# Altium footprint library IC.PcbLib: 44 footprints (part 3 of 3)
Each footprint in its own frame and in the unit in brackets; x right, y up, seen from the top. Pads: shape width x height; smd on the part's side, far side on the other; paste and mask are expansions set on the pad; w line width, h text height; cw(c..) or ccw(c..) is an arc to the next point about the centre after c.
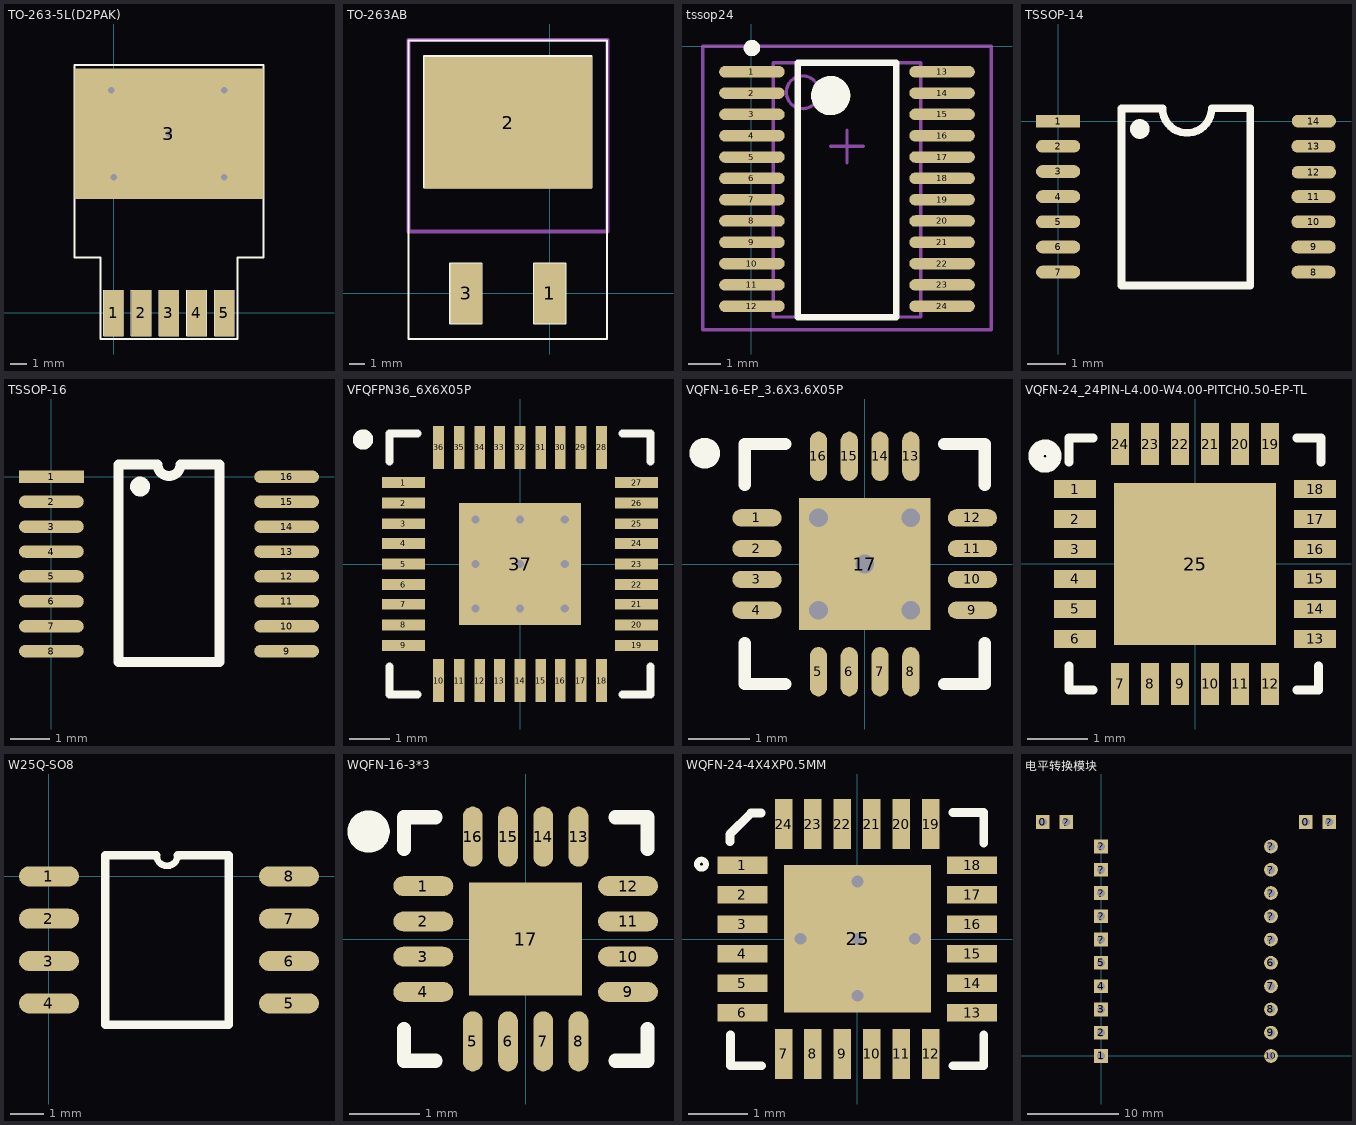
[diagram p2: the footprints below, top view; thin cyan lines are the x and y axes]

## TO-263-5L(D2PAK) [mm]
pads (6):
  rect 1.203x2.803 smd: 1(0,0) 2(1.7,0) 3(3.4,0) 4(5.1,0) 5(6.8,0)
  rect 11.6x8 smd: 3(3.4,11)
via 3.4,11 diameter 0.7 hole 0.4
via 0,8.333 diameter 0.7 hole 0.4
via 6.8,13.667 diameter 0.7 hole 0.4
via 6.8,8.333 diameter 0.7 hole 0.4
via -0.127,13.667 diameter 0.7 hole 0.4
Top Overlay:
  lines w0.025: -0.6,-1.398 0.604,-1.398 ; -0.6,-1.398 -0.6,1.406 ; -0.6,-1.398 0.604,-1.398 ; -0.6,-1.398 -0.6,1.406 ; -0.6,1.406 0.604,1.406 ; -0.6,1.406 0.604,1.406 ; 0.604,-1.398 0.604,1.406 ; 0.604,-1.398 0.604,1.406 ; 1.1,-1.398 2.304,-1.398 ; 1.1,-1.398 1.1,1.406 ; 1.1,-1.398 2.304,-1.398 ; 1.1,-1.398 1.1,1.406 ; 1.1,1.406 2.304,1.406 ; 1.1,1.406 2.304,1.406 ; 2.304,-1.398 2.304,1.406 ; 2.304,-1.398 2.304,1.406 ; 2.8,-1.398 4.004,-1.398 ; 2.8,-1.398 2.8,1.406 ; 2.8,-1.398 4.004,-1.398 ; 2.8,-1.398 2.8,1.406 ; 2.8,1.406 4.004,1.406 ; 2.8,1.406 4.004,1.406 ; 4.004,-1.398 4.004,1.406 ; 4.004,-1.398 4.004,1.406 ; 4.5,-1.398 5.704,-1.398 ; 4.5,-1.398 4.5,1.406 ; 4.5,-1.398 5.704,-1.398 ; 4.5,-1.398 4.5,1.406 ; 4.5,1.406 5.704,1.406 ; 4.5,1.406 5.704,1.406 ; 5.704,-1.398 5.704,1.406 ; 5.704,-1.398 5.704,1.406 ; 6.2,-1.398 7.404,-1.398 ; 6.2,-1.398 6.2,1.406 ; 6.2,-1.398 7.404,-1.398 ; 6.2,-1.398 6.2,1.406 ; 6.2,1.406 7.404,1.406 ; 6.2,1.406 7.404,1.406 ; 7.404,-1.398 7.404,1.406 ; 7.404,-1.398 7.404,1.406
  lines w0.127: -0.798,15.204 -2.398,15.204 ; -2.398,15.204 9.202,15.204 9.202,3.404 7.602,3.404 7.602,-1.596 -0.798,-1.596 -0.798,3.404 -2.398,3.404 -2.398,15.204
3D body "User Library-D2PAK TO-263-5.STEP": height 4.87, standoff 0, extent -1.651,-0.842 8.509,13.388

## TO-263AB [mm]
pads (3):
  rect 2x3.81 smd: 1(0,0) 3(-5.325,0)
  rect 10.66x8.38 smd: 2(-2.65,10.875)
Top Overlay:
  lines w0.127: -9.018,-2.898 3.642,-2.898 3.642,16.122 -9.018,16.122 -9.018,-2.898 ; -8.018,6.742 -8.018,15.122 2.642,15.122 2.642,6.742 -8.018,6.742 ; -6.358,-1.898 -6.358,1.912 -4.358,1.912 -4.358,-1.898 -6.358,-1.898 ; -1.018,-1.898 0.982,-1.898 0.982,1.912 -1.018,1.912 -1.018,-1.898
Mechanical 13:
  lines w0.254: -9.017,3.937 -9.017,16.129 3.683,16.129 3.683,3.937 -9.017,3.937
3D body "TO263-3S.STEP": height 4.88, standoff 0.08, extent -7.692,-0.811 2.308,14.859

## tssop24 [mm]
height 1
pads (24):
  oval 2x0.35 smd: 1(0.021,-0.773) 2(0.021,-1.423) 3(0.021,-2.073) 4(0.021,-2.723) 5(0.021,-3.373) 6(0.021,-4.023) 7(0.021,-4.673) 8(0.021,-5.323) 9(0.021,-5.973) 10(0.021,-6.623) 11(0.021,-7.273) 12(0.021,-7.923) 13(5.821,-0.773) 14(5.821,-1.423) 15(5.821,-2.073) 16(5.821,-2.723) 17(5.821,-3.373) 18(5.821,-4.023) 19(5.821,-4.673) 20(5.821,-5.323) 21(5.821,-5.973) 22(5.821,-6.623) 23(5.821,-7.273) 24(5.821,-7.923)
Top Overlay:
  circle w0.6: c2.421,-1.498 r0.3
  circle w0.25: c0.021,-0.048 r0.125
  lines w0.2: 1.421,-8.255 4.421,-8.255 4.421,-0.498 1.421,-0.498 1.421,-8.255
Mechanical 13:
  circle w0.1: c1.571,-1.398 r0.5
  lines w0.1: 0.671,-8.255 5.171,-8.255 5.171,-0.498 0.671,-0.498 0.671,-8.255
Mechanical 15:
  lines w0.1: 2.421,-3.048 3.421,-3.048 ; 2.921,-3.548 2.921,-2.548 ; -1.479,-8.638 -1.479,0.002 7.321,0.002 7.321,-8.638 5.121,-8.638 0.721,-8.638 -1.479,-8.638
3D body: height 1.1, standoff 0, extent 0.671,-8.255 5.171,-0.498

## TSSOP-14 [mm] "4.96x4.40x1.00 e=0.65（蒜米工坊）"
pads (14):
  rect 1.143x0.33 smd: 1(0,0)
  oval 1.143x0.33 smd: 2(0,-0.65) 3(0,-1.3) 4(0,-1.95) 5(0,-2.6) 6(0,-3.25) 7(0,-3.9) 8(6.6,-3.9) 9(6.6,-3.25) 10(6.6,-2.6) 11(6.6,-1.95) 12(6.608,-1.321) 13(6.6,-0.65) 14(6.608,0)
Top Overlay:
  circle w0.254: c2.112,-0.203 r0.127
  lines w0.2: 2.687,0.325 1.635,0.325 1.635,-4.249 4.965,-4.249 4.965,0.325 ; 2.696,0.33 ccw(c3.331,0.33) 3.966,0.33 4.96,0.33
3D body "TSSOP14.STEP": height 1.03, standoff -0.02, extent 0.028,-4.43 6.432,0.57

## TSSOP-16 [mil] "4.96x4.40x1.00 e=0.65（蒜米工坊）"
pads (16):
  rect 65x12.5 smd: 1(0,0)
  oval 65x12.5 smd: 2(0,-25) 3(0,-50) 4(0,-75) 5(0,-100) 6(0,-125) 7(0,-150) 8(0,-175) 9(236,-175) 10(236,-150) 11(236,-125) 12(236,-100) 13(236,-75) 14(236,-50) 15(236,-25) 16(236,0)
Top Overlay:
  lines w10: 89,-14.79 cw(c89,-9.79) 89.71,-14.74 ; 67.5,-186 67.5,12.5 106.46,12.5 ccw(c118,12.5) 129.54,12.5 168.5,12.5 168.5,-186 67.5,-186
3D body "TSSOP16.STEP": height 40.55, standoff -0.76, extent -6.06,-187.42 246.08,9.43

## VFQFPN36_6X6X05P [mil]
pads (37):
  rect 41.5x10.5 smd: 1(-113,79) 2(-113,59) 3(-113,39) 4(-113,20) 5(-113,0) 6(-113,-20) 7(-113,-39) 8(-113,-59) 9(-113,-79) 19(113,-79) 20(113,-59) 21(113,-39) 22(113,-20) 23(113,0) 24(113,20) 25(113,39) 26(113,59) 27(113,79)
  rect 10.5x41.5 smd: 10(-79,-113) 11(-59,-113) 12(-39,-113) 13(-20,-113) 14(0,-113) 15(20,-113) 16(39,-113) 17(59,-113) 18(79,-113) 28(79,113) 29(59,113) 30(39,113) 31(20,113) 32(0,113) 33(-20,113) 34(-39,113) 35(-59,113) 36(-79,113)
  rect 118.5x118.5 smd: 37(0,0)
via -43.3,43.3 diameter 19.7 hole 7.9
via 0,43.3 diameter 19.7 hole 7.9
via 43.3,43.3 diameter 19.7 hole 7.9
via -43.3,0 diameter 19.7 hole 7.9
via 0,0 diameter 19.7 hole 7.9
via 43.3,0 diameter 19.7 hole 7.9
via -43.3,-43.3 diameter 19.7 hole 7.9
via 0,-43.3 diameter 19.7 hole 7.9
via 43.3,-43.3 diameter 19.7 hole 7.9
Top Overlay:
  lines w7.9: -126.6,-99.4 -126.6,-126.6 -99.4,-126.6 ; -126.6,99.4 -126.6,126.6 -99.4,126.6 ; 99.4,-126.6 126.6,-126.6 126.6,-99.4 ; 99.4,126.6 126.6,126.6 126.6,99.4
  lines w9.8: -147.3,120.6 cw(c-152.2,120.65) -147.3,120.7

## VQFN-16-EP_3.6X3.6X05P [mm]
pads (17):
  oval 0.8x0.28 smd: 1(-1.75,0.75) 2(-1.75,0.25) 3(-1.75,-0.25) 4(-1.75,-0.75) 9(1.75,-0.75) 10(1.75,-0.25) 11(1.75,0.25) 12(1.75,0.75)
  oval 0.28x0.8 smd: 5(-0.75,-1.75) 6(-0.25,-1.75) 7(0.25,-1.75) 8(0.75,-1.75) 13(0.75,1.75) 14(0.25,1.75) 15(-0.25,1.75) 16(-0.75,1.75)
  rect 2.14x2.14 smd: 17(0,0)
via 0.75,-0.75 diameter 0.61 hole 0.305
via -0.75,-0.75 diameter 0.61 hole 0.305
via -0.75,0.75 diameter 0.61 hole 0.305
via 0.75,0.75 diameter 0.61 hole 0.305
via 0,0 diameter 0.61 hole 0.305
Top Overlay:
  lines w0.2: -1.95,-1.29 -1.95,-1.95 -1.29,-1.95 ; -1.95,1.29 -1.95,1.95 -1.29,1.95 ; 1.29,-1.95 1.95,-1.95 1.95,-1.29 ; 1.29,1.95 1.95,1.95 1.95,1.29
  lines w0.25: -2.474,1.798 cw(c-2.599,1.8) -2.474,1.801
Top Paste:
  region: -0.15,1 -0.15,0.15 -1,0.15 -1,1
  region: -1,-1 -1,-0.15 -0.15,-0.15 -0.15,-1
  region: 1,1 1,0.15 0.15,0.15 0.15,1
  region: 0.15,-1 0.15,-0.15 1,-0.15 1,-1

## VQFN-24_24PIN-L4.00-W4.00-PITCH0.50-EP-TL [mm]
pads (25):
  rect 0.7x0.3 smd: 1(-2,1.25) 2(-2,0.75) 3(-2,0.25) 4(-2,-0.25) 5(-2,-0.75) 6(-2,-1.25) 13(2,-1.25) 14(2,-0.75) 15(2,-0.25) 16(2,0.25) 17(2,0.75) 18(2,1.25)
  rect 0.3x0.7 smd: 7(-1.25,-2) 8(-0.75,-2) 9(-0.25,-2) 10(0.25,-2) 11(0.75,-2) 12(1.25,-2) 19(1.25,2) 20(0.75,2) 21(0.25,2) 22(-0.25,2) 23(-0.75,2) 24(-1.25,2)
  rect 2.7x2.7 smd: 25(-0.001,-0.001)
Top Overlay:
  circle w0.254: c-2.504,1.8 r0.15
  lines w0.15: -2.104,1.7 -2.104,2.1 -1.7,2.1 ; -2.1,-1.7 -2.1,-2.1 -1.7,-2.1 ; 1.696,2.1 2.096,2.1 2.096,1.7 ; 1.7,-2.1 2.059,-2.1 2.059,-1.7

## W25Q-SO8 [mm]
pads (8):
  oval 1.8x0.6 smd: 1(0,0) 2(0,-1.27) 3(0,-2.54) 4(0,-3.81) 5(7.2,-3.81) 6(7.2,-2.54) 7(7.2,-1.27) 8(7.2,0)
Top Overlay:
  lines w0.2: 3.225,0.635 ccw(c3.542,0.635) 3.86,0.635
  lines w0.254: 3.225,0.635 1.687,0.635 1.687,-4.445 5.397,-4.445 5.397,0.635 3.86,0.635
3D body "SOIC8_Wide.STEP": height 1.75, standoff -0.01, extent -0.452,-4.63 7.65,0.83

## WQFN-16-3*3 [mm]
pads (17):
  oval 0.85x0.28 smd: 1(-1.45,0.749) 2(-1.45,0.249) 3(-1.45,-0.249) 4(-1.45,-0.749) 9(1.45,-0.749) 10(1.45,-0.249) 11(1.45,0.249) 12(1.45,0.749)
  oval 0.28x0.85 smd: 5(-0.749,-1.45) 6(-0.249,-1.45) 7(0.249,-1.45) 8(0.749,-1.45) 13(0.749,1.45) 14(0.249,1.45) 15(-0.249,1.45) 16(-0.749,1.45)
  rect 1.6x1.6 smd: 17(0,0)
Top Overlay:
  lines w0.2: -1.725,-1.275 -1.725,-1.725 -1.275,-1.725 ; -1.725,1.275 -1.725,1.725 -1.275,1.725 ; 1.275,-1.725 1.725,-1.725 1.725,-1.275 ; 1.275,1.725 1.725,1.725 1.725,1.275
  lines w0.3: -2.075,1.521 cw(c-2.225,1.523) -2.075,1.524
3D body: height 0.6, standoff 0, extent -1.651,-1.651 1.651,1.651

## WQFN-24-4X4XP0.5MM [mil]
pads (25):
  rect 33.4x11.8 smd: 1(-76.75,49.2) 2(-76.75,29.5) 3(-76.75,9.8) 4(-76.75,-9.9) 5(-76.75,-29.5) 6(-76.75,-49.2) 13(76.75,-49.2) 14(76.75,-29.5) 15(76.75,-9.9) 16(76.75,9.8) 17(76.75,29.5) 18(76.75,49.2)
  rect 11.8x33.4 smd: 7(-49.15,-76.8) 8(-29.55,-76.8) 9(-9.85,-76.8) 10(9.85,-76.8) 11(29.55,-76.8) 12(49.25,-76.8) 19(49.25,76.8) 20(29.55,76.8) 21(9.85,76.8) 22(-9.85,76.8) 23(-29.55,76.8) 24(-49.15,76.8)
  rect 98.4x98.4 smd: 25(0.25,0.2)
via 0.25,-37.99 diameter 19.68 hole 7.87
via -37.94,0.2 diameter 19.68 hole 7.87
via 0.25,38.39 diameter 19.68 hole 7.87
via 38.44,0.2 diameter 19.68 hole 7.87
via 0.25,0.2 diameter 24 hole 7.87
Top Overlay:
  circle w3.94: c-104,50 r3
  lines w5.91: -85,65 -85,70 -70.86,84.2 -64.15,84.2 ; -84.65,-64 -84.65,-84.7 -63.95,-84.7 ; 64.05,-84.7 84.65,-84.7 84.65,-64 ; 64.05,84.6 84.65,84.6 84.65,64

## 电平转换模块 [mm] "Connector; Header; 2 Position"
height 2.65
pads (24):
  rect 1.5x1.5 hole 0.9: 0(-6.35,25.527) 0(22.352,25.527) 1(0,0) 2(0,2.54) 3(0,5.08) 4(0,7.62) 5(0,10.16) ？(-3.81,25.527) ？(0,12.7) ？(0,15.24) ？(0,17.78) ？(0,20.32) ？(0,22.86) ？(24.892,25.527)
  round 1.5 hole 0.9: 6(18.542,10.16) 7(18.542,7.62) 8(18.542,5.08) 9(18.542,2.54) 10(18.542,0) ？(18.542,12.7) ？(18.542,15.24) ？(18.542,17.78) ？(18.542,20.32) ？(18.542,22.86)